# Altium schematic symbol library lib_datalogger.SchLib: 1246 symbols (part 4 of 16)
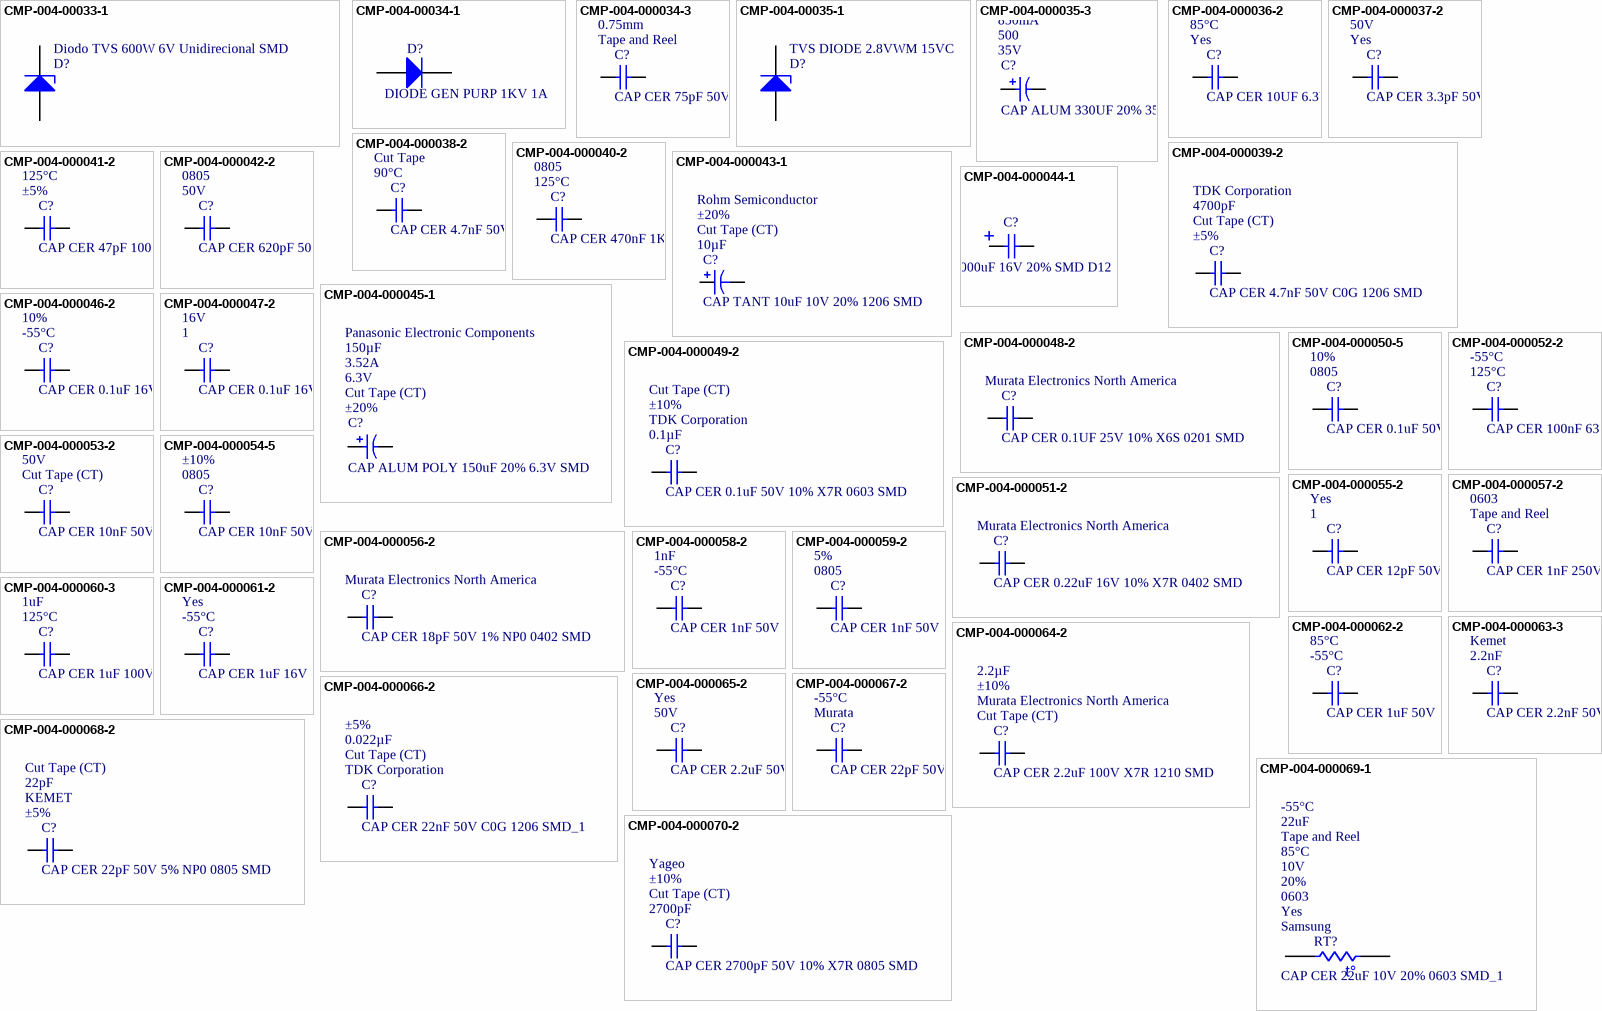
[diagram p46: symbols CMP-004-00033-1 to CMP-004-000070-2]

## CMP-004-000038-2
designator C?, comment CAP CER 4.7nF 50V C0G 0805 SMD  Max Operating Temperature: 90°C  Packaging: Cut Tape  Case/Package: 0805  Min Operating Temperature: -55°C  Tolerance: 10%  Capacitance: 4.7nF  Manufacturer: KEMET  Voltage Rating: 50V
Cap Ceramic 0.0047uF 50V X7R 10% Pad SMD 0805 125C Automotive T/R; Manufacturer Part Number: C0805C472K5RECAUTO; Max Output Current: 500mA; Min Input Voltage: 9V; Max Input Voltage: 18V; Number of Outputs: 1; Voltage - Output 1: 12V; Isolation Voltage: 3kV; Efficiency: 83%; Max Power Dissipation: 6W; Pricing 1: 1=0,30000, 10=0,20400, 100=0,11580, 500=0,08172, 1000=0,07151 (USD); Stock 1: 7793; ComponentLink2Description: https://api.kemet.com/component-edge/download/datasheet/C0805C472K5RECAUTO.pdf?src-supplier=Digi-Key; ComponentLink2URL: https://api.kemet.com/component-edge/download/datasheet/C0805C472K5RECAUTO.pdf?src-supplier=Digi-Key; ComponentLink1Description: https://product.tdk.com/info/en/catalog/datasheets/mlcc_commercial_general_en.pdf; Mount: Surface Mount; Design Item ID: CAP CER 4.7nF 50V C0G 0805 SMD; Case Code (Metric): 2012; Case Code (Imperial): 0805; ComponentLink1URL: https://product.tdk.com/info/en/catalog/datasheets/mlcc_commercial_general_en.pdf; Ratings: AEC-Q200; Features: UVLO; Source: mits.SchLib
footprint CC1005-0402 (Chip Capacitor; Body 0.039" L x 0.020" W (1.00mm x 0.50mm))
footprint CC2012-0805 (Chip Capacitor)
pins: 1, 2

## CMP-004-000039-2
designator C?, comment CAP CER 4.7nF 50V C0G 1206 SMD  Tolerance: ±5%  Packaging: Cut Tape (CT)  Capacitance: 4700pF  Manufacturer: TDK Corporation
CAP CER 4700PF 50V C0G 1206; Manufacturer Part Number: C3216C0G1H472J060AA; Temperature Coefficient: C0G, NP0; Operating Temperature: -55°C ~ 125°C; Voltage - Rated: 50V; Failure Rate: -; Height - Seated (Max): -; Applications: General Purpose; Category: Capacitors; Stock 1: 3298; Size / Dimension: 0.126" L x 0.063" W (3.20mm x 1.60mm); Lead Style: -; Features: Low ESL; Ratings: -; Pricing 1: 1=0.32, 10=0.267, 100=0.1333, 250=0.1, 500=0.08832, 1000=0.07833 (USD); Package / Case: 1206 (3216 Metric); Source: mits.SchLib; Lead Spacing: -; Part Status: Active; ComponentLink1Description: https://product.tdk.com/info/en/catalog/datasheets/mlcc_commercial_general_en.pdf; Thickness (Max): 0.028" (0.70mm); RoHS: RoHS Compliant; Design Item ID: CAP CER 4.7nF 50V C0G 1206 SMD; ComponentLink1URL: https://product.tdk.com/info/en/catalog/datasheets/mlcc_commercial_general_en.pdf; Mounting Type: Surface Mount, MLCC
footprint CC1005-0402 (Chip Capacitor; Body 0.039" L x 0.020" W (1.00mm x 0.50mm))
footprint CC3216-1206 (Chip Capacitor; Body 3.2 x 1.6 mm (LxW typ))
pins: 1, 2

## CMP-004-000040-2
designator C?, comment CAP CER 470nF 1KV X7R 3216 SMD  Max Operating Temperature: 125°C  Case/Package: 0805  Voltage Rating: 1kV  Packaging: Tape and Reel  Capacitance: 4.7nF  Tolerance: 10%  Min Operating Temperature: -55°C  Manufacturer: Wurth Electronics  Package Quantity: 1
CAP CER 4700pF 1KV  3216 SMD; Manufacturer Part Number: 885342208020; Dissipation Factor: 2.5%; Dielectric Material: Ceramic; Temperature Coefficient: 30ppm/°C; ComponentLink13URL: https://datasheet.ciiva.com/153/aphvc-153204.pdf?src-supplier=Digi-Key; ComponentLink18Description: https://datasheet.ciiva.com/11520/aphvc-11520843.pdf?src-supplier=Avnet; ComponentLink20Description: https://datasheet.ciiva.com/146/docfinderpartnumber-c1206c472kdractu-146779.pdf?src-supplier=Digi-Key; ComponentLink8Description: https://api.kemet.com/component-edge/download/datasheet/C0805V472KDRACTU.pdf?src-supplier=Digi-Key; ComponentLink8URL: https://api.kemet.com/component-edge/download/datasheet/C0805V472KDRACTU.pdf?src-supplier=Digi-Key; Lead Free: Lead Free; ComponentLink16Description: https://datasheet.ciiva.com/7833/614334-7833527.pdf?src-supplier=Element14; ComponentLink4Description: http://www.farnell.com/datasheets/2740387.pdf?src-supplier=Farnell; ComponentLink12Description: https://datasheet.ciiva.com/11787/0900766b80ed4c37-11787782.pdf?src-supplier=RSComponents; Radiation Hardening: No; Width: 0.049inch; Stock 1: 561; Dielectric: X7R; ComponentLink21Description: https://datasheet.ciiva.com/14593/70096142-14593054.pdf?src-supplier=Allied+Electronics; ComponentLink1Description: http://www.farnell.com/datasheets/2547068.pdf?src-supplier=Farnell; Category: Ceramic Capacitors; Source: mits.SchLib; ComponentLink15URL: https://datasheet.ciiva.com/153/aphvc-153206.pdf?src-supplier=Digi-Key; ComponentLink9URL: http://www.farnell.com/datasheets/1526458.pdf?src-supplier=Element14; ComponentLink11URL: https://datasheet.ciiva.com/19476/1041285-19476096.pdf?src-supplier=Jameco; Thickness: 0.055inch; ComponentLink10URL: http://www.farnell.com/datasheets/2120589.pdf?src-supplier=Element14; ComponentLink5Description: http://www.mouser.com/ds/2/212/KEM_C1034_X7R_HV_ARC_SMD-1101730.pdf?src-supplier=Mouser; ComponentLink18URL: https://datasheet.ciiva.com/11520/aphvc-11520843.pdf?src-supplier=Avnet; Design Item ID: CAP CER 470nF 1KV X7R 3216 SMD; Voltage Rating (DC): 1kV; Voltage: 1kV; ComponentLink7Description: http://www.farnell.com/datasheets/2740387.pdf?src-supplier=Newark; ComponentLink17Description: https://datasheet.ciiva.com/7833/614334-7833528.pdf?src-supplier=Element14; ComponentLink2Description: http://uk.rs-online.com/webdocs/1528/0900766b81528e46.pdf?src-supplier=RSComponents; Mount: Surface Mount; Length: 0.079inch; ComponentLink21URL: https://datasheet.ciiva.com/14593/70096142-14593054.pdf?src-supplier=Allied+Electronics; ComponentLink15Description: https://datasheet.ciiva.com/153/aphvc-153206.pdf?src-supplier=Digi-Key; Termination: SMD/SMT; ComponentLink20URL: https://datasheet.ciiva.com/146/docfinderpartnumber-c1206c472kdractu-146779.pdf?src-supplier=Digi-Key; Height: 1.25mm; Case Code (Imperial): 0805; Case Code (Metric): 2012; ComponentLink11Description: https://datasheet.ciiva.com/19476/1041285-19476096.pdf?src-supplier=Jameco; Pricing 1: 1=0,48000, 10=0,33000, 50=0,23100, 100=0,19800, 500=0,14850, 1000=0,12540 (USD); ComponentLink13Description: https://datasheet.ciiva.com/153/aphvc-153204.pdf?src-supplier=Digi-Key; ComponentLink6Description: http://components.arrow.com/part/dataview/0323_04088197?src-supplier=Arrow+Europe; ComponentLink4URL: http://www.farnell.com/datasheets/2740387.pdf?src-supplier=Farnell; ComponentLink6URL: http://components.arrow.com/part/dataview/0323_04088197?src-supplier=Arrow+Europe; Stock 2: 6610; ComponentLink2URL: http://uk.rs-online.com/webdocs/1528/0900766b81528e46.pdf?src-supplier=RSComponents; ComponentLink3Description: http://www.alliedelec.com/images/products/datasheets/bm/KEMET/70395618.pdf?src-supplier=Allied+Electronics; ComponentLink7URL: http://www.farnell.com/datasheets/2740387.pdf?src-supplier=Newark; ComponentLink14URL: https://datasheet.ciiva.com/153/aphvc-153205.pdf?src-supplier=Digi-Key; Pricing 2: 1=0,34000, 10=0,23300, 50=0,16320, 100=0,13990, 500=0,10494, 1000=0,08862 (USD); REACH SVHC: No SVHC; ComponentLink19Description: https://datasheet.ciiva.com/14594/70001075-14594431.pdf?src-supplier=Allied+Electronics; ComponentLink16URL: https://datasheet.ciiva.com/7833/614334-7833527.pdf?src-supplier=Element14; ComponentLink9Description: http://www.farnell.com/datasheets/1526458.pdf?src-supplier=Element14; ComponentLink19URL: https://datasheet.ciiva.com/14594/70001075-14594431.pdf?src-supplier=Allied+Electronics; ComponentLink3URL: http://www.alliedelec.com/images/products/datasheets/bm/KEMET/70395618.pdf?src-supplier=Allied+Electronics; ComponentLink12URL: https://datasheet.ciiva.com/11787/0900766b80ed4c37-11787782.pdf?src-supplier=RSComponents; ComponentLink14Description: https://datasheet.ciiva.com/153/aphvc-153205.pdf?src-supplier=Digi-Key; ComponentLink10Description: http://www.farnell.com/datasheets/2120589.pdf?src-supplier=Element14; ComponentLink5URL: http://www.mouser.com/ds/2/212/KEM_C1034_X7R_HV_ARC_SMD-1101730.pdf?src-supplier=Mouser; ComponentLink1URL: http://www.farnell.com/datasheets/2547068.pdf?src-supplier=Farnell; Depth: 1.25mm; ComponentLink17URL: https://datasheet.ciiva.com/7833/614334-7833528.pdf?src-supplier=Element14; Number of Pins: 2; RoHS: No; Contact Plating: Tin,Matte
footprint CC1005-0402 (Chip Capacitor; Body 0.039" L x 0.020" W (1.00mm x 0.50mm))
footprint CC3216-1206 (Chip Capacitor; Body 3.2 x 1.6 mm (LxW typ))
pins: 1, 2

## CMP-004-000041-2
designator C?, comment CAP CER 47pF 100V NP0 0603 SMD  Tolerance: ±5%  Max Operating Temperature: 125°C  Min Operating Temperature: -55°C  Package Quantity: 1  Capacitance: 47pF  Packaging: Cut Tape (CT)  Case/Package: 0603  RoHS Compliant: Yes  Manufacturer: Kemet
CAP CER 47PF 100V C0G/NP0 0603; Manufacturer Part Number: C0603C470J1GACTU; Dielectric: C0G; Material: Ceramic; Temperature Coefficient: C0G, NP0; Thickness: 0.035inch; Part Status: Active; Case Code (Metric): 1608; Size / Dimension: 0.063" L x 0.031" W (1.60mm x 0.80mm); Mounting Type: Surface Mount, MLCC; Design Item ID: CAP CER 47pF 100V NP0 0603 SMD; Pricing 1: 1=0.1, 10=0.041, 50=0.0222, 100=0.0187, 250=0.01532, 500=0.0131, 1000=0.0102 (USD); Construction: Flat; Category: Capacitors; Stock 2: 970650; Ratings: -; Features: Low ESL; ComponentLink5Description: https://datasheet.ciiva.com/26310/mlcc-catalogdownload2013-eng-26310294.pdf?src-supplier=Distrelec; Depth: 0.8mm; Radiation Hardening: No; RoHS: RoHS Compliant; Package / Case: 0603 (1608 Metric); ComponentLink3Description: https://datasheet.ciiva.com/26838/getdatasheetpartid-359564-26838540.pdf?src-supplier=Verical; Voltage - Rated: 100V; Case Code (Imperial): 0603; ComponentLink2URL: https://datasheet.ciiva.com/25803/cl10c470jb8nnnc-25803543.pdf?src-supplier=Digi-Key; Applications: General Purpose; ComponentLink3URL: https://datasheet.ciiva.com/26838/getdatasheetpartid-359564-26838540.pdf?src-supplier=Verical; Pricing 2: 50=0,00730, 500=0,00550, 1500=0,00510, 5000=0,00480, 25000=0,00460, 50000=0,00460, 50=0,00710, 500=0,00530, 1500=0,00490, 5000=0,00470, 25000=0,00440, 50000=0,00440, 50=0,03680, 500=0,02760, 1500=0,02560, 5000=0,02430, 25000=0,02300, 50000=0,02300, 50=0,03540, 500=0,02650, 1500=0,02460, 5000=0,02340, 25000=0,02210, 50000=0,02210, 50=0,00480, 500=0,00360, 1500=0,00330, 5000=0,00310, 25000=0,00300, 50000=0,00300, 50=0,00410, 500=0,00300, 1500=0,00280, 5000=0,00270, 25000=0,00250, 50000=0,00250, 50=0,04350, 500=0,03260, 1500=0,03030, 5000=0,02880, 25000=0,02720, 50000=0,02720, 50=0,61520, 500=0,46140, 1500=0,42850, 5000=0,40650, 25000=0,38450, 50000=0,38450, 50=0,02320, 500=0,01740, 1500=0,01620, 5000=0,01530, 25000=0,01450, 50000=0,01450, 50=0,42360, 500=0,31770, 1500=0,29500, 5000=0,27990, 25000=0,26480, 50000=0,26480, 50=0,04860, 500=0,03650, 1500=0,03390, 5000=0,03210, 25000=0,03040, 50000=0,03040, 50=0,00750, 500=0,00570, 1500=0,00530, 5000=0,00500, 25000=0,00470, 50000=0,00470, 50=0,00560, 500=0,00420, 1500=0,00390, 5000=0,00370, 25000=0,00350, 50000=0,00350 (AUD); ComponentLink2Description: https://datasheet.ciiva.com/25803/cl10c470jb8nnnc-25803543.pdf?src-supplier=Digi-Key; Height - Seated (Max): -; Stock 1: 275177; Source: mits.SchLib; Height: 0.8mm; ComponentLink1URL: http://www.kemet.com/docfinder?Partnumber=C0603C470J1GACTU; Width: 0.031inch; Series: CL; ComponentLink5URL: https://datasheet.ciiva.com/26310/mlcc-catalogdownload2013-eng-26310294.pdf?src-supplier=Distrelec; Thickness (Max): 0.034" (0.87mm); ComponentLink1Description: http://www.kemet.com/docfinder?Partnumber=C0603C470J1GACTU; Lead Style: -; ComponentLink4Description: https://datasheet.ciiva.com/29198/456890-da-01-en-vs-kondensator-0603-29198885.pdf?src-supplier=Conrad; Lead Spacing: -; Lead Free: Lead Free; Mount: Surface Mount; Operating Temperature: -55°C ~ 125°C; ComponentLink4URL: https://datasheet.ciiva.com/29198/456890-da-01-en-vs-kondensator-0603-29198885.pdf?src-supplier=Conrad; Length: 1.6mm
footprint CC1005-0402 (Chip Capacitor; Body 0.039" L x 0.020" W (1.00mm x 0.50mm))
footprint CC1608-0603 (Chip Capacitor; Body 1.6 x 0.8 mm (LxW typ))
pins: 1, 2

## CMP-004-000042-2
designator C?, comment CAP CER 620pF 50V C0G 0805 SMD  Voltage Rating: 50V  Case/Package: 0805  Package Quantity: 4000  Capacitance: 620pF  Manufacturer: Kyocera AVX  Min Operating Temperature: -55°C  Packaging: Tape and Reel  Tolerance: 5%  Max Operating Temperature: 125°C
CAP CER 620PF 50V NP0 0805; Manufacturer Part Number: 08055A621JAT2A; Voltage Rating (DC): 50V; Category: Ceramic Capacitors; Termination: SMD/SMT; ComponentLink3Description: https://datasheet.ciiva.com/5418/ccog-243403-5418887.pdf?src-supplier=Mouser; Case Code (Imperial): 0805; Pricing 1: 1=0,32000, 10=0,22100, 100=0,13280, 500=0,09962, 1000=0,08412 (USD); Radiation Hardening: No; Source: mits.SchLib; Mount: Surface Mount; REACH SVHC: Unknown; Dielectric: C0G; Thickness: 0.037inch; RoHS: Yes; Depth: 1.25mm; ComponentLink1Description: https://datasheet.ciiva.com/207/ccog-207129.pdf?src-supplier=Digi-Key; Stock 1: 99192; Design Item ID: CAP CER 620pF 50V C0G 0805 SMD; Height: 0.94mm; ComponentLink3URL: https://datasheet.ciiva.com/5418/ccog-243403-5418887.pdf?src-supplier=Mouser; ComponentLink2Description: https://datasheet.ciiva.com/11565/ccog-11565614.pdf?src-supplier=Avnet; ComponentLink2URL: https://datasheet.ciiva.com/11565/ccog-11565614.pdf?src-supplier=Avnet; Number of Pins: 2; Width: 1.25mm; Length: 2.01mm; ComponentLink1URL: https://datasheet.ciiva.com/207/ccog-207129.pdf?src-supplier=Digi-Key; Case Code (Metric): 2012
footprint CC1005-0402 (Chip Capacitor; Body 0.039" L x 0.020" W (1.00mm x 0.50mm))
footprint CC2012-0805 (Chip Capacitor)
pins: 1, 2

## CMP-004-000043-1
designator C?, comment CAP TANT 10uF 10V 20% 1206 SMD  Capacitance: 10µF  Packaging: Cut Tape (CT)  Tolerance: ±20%  Manufacturer: Rohm Semiconductor
CAP TANT 10UF 10V 20% 1206; Manufacturer Part Number: TCA1A106M8R; Manufacturer Size Code: A; Type: Molded; ESR (Equivalent Series Resistance): 3 Ohm; Pricing 1: 1=0.52, 10=0.368, 25=0.3144, 50=0.2784, 100=0.2425, 250=0.2066, 500=0.17964, 1000=0.15269 (USD); Failure Rate: -; Category: Capacitors; Features: General Purpose; ComponentLink1URL: http://rohmfs.rohm.com/en/products/databook/datasheet/passive/tantalum_capacitor/tantalum_chip_capacitor/tc_a.pdf; Voltage - Rated: 10V; Size / Dimension: 0.126" L x 0.063" W (3.20mm x 1.60mm); Part Status: Active; Mounting Type: Surface Mount; Lead Spacing: -; Package / Case: 1206 (3216 Metric); RoHS: RoHS Compliant; Stock 1: 45858; ComponentLink1Description: http://rohmfs.rohm.com/en/products/databook/datasheet/passive/tantalum_capacitor/tantalum_chip_capacitor/tc_a.pdf; Design Item ID: CAP TANT 10uF 10V 20% 1206 SMD; Lifetime @ Temp.: -; Height - Seated (Max): 0.071" (1.80mm); Source: mits.SchLib; Operating Temperature: -55°C ~ 125°C
footprint CAP TANT CASE R 0805 (0.081" L x 0.051" W (2.05mm x 1.30mm))
footprint CC TANT 1206
pins: 1, 2

## CMP-004-000044-1
designator C?, comment CAP ALUM 1000uF 16V 20% SMD D12 1010  Max Operating Temperature: 105°C  Capacitance: 1000uF  Tolerance: 20%  Min Operating Temperature: -55°C  RoHS Compliant: Yes
SMD 1000UF ±20% 16V SMD,10X10MM ROHS; Manufacturer Part Number 1: EEE-FN1C102UP; Manufacturer 1: Panasonic; Dielectric: X5R; Dielectric Material: Electrolytic; Design Item ID: CAP ALUM 1000uF 16V 20% SMD D12 1010; Source: mits.SchLib; Voltage Rating (DC): 16V
footprint CAP_SMD_D12_1010
footprint CAP_SMD_D12_1010
pins: 1, 2

## CMP-004-000045-1
designator C?, comment CAP ALUM POLY 150uF 20% 6.3V SMD  Tolerance: ±20%  Packaging: Cut Tape (CT)  Voltage Rating: 6.3V  Ripple Current: 3.52A  Capacitance: 150µF  Manufacturer: Panasonic Electronic Components
Manufacturer Part Number: 6SVPE150M; Surface Mount Land Size: 0.209" L x 0.209" W (5.30mm x 5.30mm); ESR (Equivalent Series Resistance): 12 mOhm; Polarization: Polar; Lifetime @ Temp.: 2000 Hrs @ 105°C; Source: mits.SchLib; Operating Temperature: -55°C ~ 105°C; Applications: -; Part Status: Active; Size / Dimension: 0.197" Dia (5.00mm); Mounting Type: Surface Mount; ComponentLink1Description: http://industrial.panasonic.com/www-cgi/jvcr13pz.cgi?E+CI+4+AAB8002+6SVPE150M+8+WW; Height - Seated (Max): 0.236" (6.00mm); Pricing 1: 1=1.05, 10=0.881, 25=0.7592, 50=0.7126, 100=0.5625, 250=0.46876, 500=0.42188 (USD); Design Item ID: CAP ALUM POLY 150uF 20% 6.3V SMD; Lead Spacing: -; Category: Capacitors; ComponentLink1URL: http://industrial.panasonic.com/www-cgi/jvcr13pz.cgi?E+CI+4+AAB8002+6SVPE150M+8+WW; Package / Case: Radial, Can - SMD; Stock 1: 3806; RoHS: RoHS Compliant; Impedance: -
footprint CAP_SMD_D5_H6
footprint CAP_SMD_D5_H6
pins: 1, 2
1 alternate drawing of the same symbol

## CMP-004-000046-2
designator C?, comment CAP CER 0.1uF 16V 10% X7R 0402 SMD  Min Operating Temperature: -55°C  Tolerance: 10%  Manufacturer: Murata Electronics North America  Capacitance: 100nF  Max Operating Temperature: 125°C  Voltage Rating: 16V  Packaging: Tape and Reel  Case/Package: 0402  Package Quantity: 1
CAP CER 0.1UF 16V X7R 0402; Part#: GRM155R71C104KA88D; Manufacturer Part Number: CL05B104KO5NNNC; eVendorPrice: 0,10; Material: Ceramic; eVendor: Digi-Key; MSRP: 0,00313; eVendor#: 490-3261-1-ND; Case Code (Metric): 1005; ComponentLink2URL: https://datasheet.ciiva.com/29198/458718-da-01-en-vs-kondensator-0402-29198423.pdf?src-supplier=Conrad; Mount: Surface Mount; Case Code (Imperial): 0402; ComponentLink1URL: https://datasheet.ciiva.com/26920/getdatasheetpartid-359683-26920169.pdf?src-supplier=Verical; Height: 0.5mm; Category: Ceramic Capacitors; Dielectric: X7R; Voltage Rating (DC): 16V; ComponentLink4URL: https://datasheet.ciiva.com/26309/mlcc-catalogdownload2013-eng-26309003.pdf?src-supplier=Distrelec; RoHS: Yes; Source: mits.SchLib; Depth: 0.5mm; ComponentLink3Description: https://datasheet.ciiva.com/16208/cl05b104kq5nnnc-16208343.pdf?src-supplier=Future+Electronics; Design Item ID: CAP CER 0.1uF 16V 10% X7R 0402 SMD; Length: 1mm; ComponentLink1Description: https://datasheet.ciiva.com/26920/getdatasheetpartid-359683-26920169.pdf?src-supplier=Verical; ComponentLink3URL: https://datasheet.ciiva.com/16208/cl05b104kq5nnnc-16208343.pdf?src-supplier=Future+Electronics; MOQ: 5000; Thickness: 0.022inch; Datasheet: http://search.murata.co.jp/Ceramy/image/img/A01X/G101/ENG/GRM155R71C104KA88-01.pdf; Width: 0.02inch; Radiation Hardening: No; Contact Plating: Tin; Voltage: 16V; ComponentLink4Description: https://datasheet.ciiva.com/26309/mlcc-catalogdownload2013-eng-26309003.pdf?src-supplier=Distrelec; Lead Free: Lead Free; ComponentLink2Description: https://datasheet.ciiva.com/29198/458718-da-01-en-vs-kondensator-0402-29198423.pdf?src-supplier=Conrad; Stock 1: 7150300; Pricing 1: 100=0,00220, 1000=0,00170, 3000=0,00160, 10000=0,00140, 50000=0,00140, 100000=0,00130, 100=0,00210, 1000=0,00160, 3000=0,00150, 10000=0,00140, 50000=0,00140, 100000=0,00130, 100=0,01120, 1000=0,00850, 3000=0,00790, 10000=0,00720, 50000=0,00720, 100000=0,00660, 100=0,01070, 1000=0,00820, 3000=0,00760, 10000=0,00690, 50000=0,00690, 100000=0,00630, 100=0,00140, 1000=0,00110, 3000=0,00100, 10000=0,00090, 50000=0,00090, 100000=0,00080, 100=0,00120, 1000=0,00090, 3000=0,00090, 10000=0,00080, 50000=0,00080, 100000=0,00070, 100=0,01320, 1000=0,01010, 3000=0,00930, 10000=0,00860, 50000=0,00860, 100000=0,00780, 100=0,18680, 1000=0,14280, 3000=0,13180, 10000=0,12090, 50000=0,12090, 100000=0,10990, 100=0,00700, 1000=0,00540, 3000=0,00500, 10000=0,00460, 50000=0,00460, 100000=0,00410, 100=0,12860, 1000=0,09830, 3000=0,09080, 10000=0,08320, 50000=0,08320, 100000=0,07570, 100=0,01480, 1000=0,01130, 3000=0,01040, 10000=0,00960, 50000=0,00960, 100000=0,00870, 100=0,00230, 1000=0,00180, 3000=0,00160, 10000=0,00150, 50000=0,00150, 100000=0,00130, 100=0,00170, 1000=0,00130, 3000=0,00120, 10000=0,00110, 50000=0,00110, 100000=0,00100 (AUD)
footprint CC1005-0402 (Chip Capacitor; Body 0.039" L x 0.020" W (1.00mm x 0.50mm))
footprint CC1005-0402-3 (Chip Capacitor; Body 0.039" L x 0.020" W (1.00mm x 0.50mm))
pins: 1, 2

## CMP-004-000047-2
designator C?, comment CAP CER 0.1uF 16V 10% X7R 0603 SMD  Package Quantity: 1  Voltage Rating: 16V  Packaging: Tape and Reel  RoHS Compliant: Yes  Min Operating Temperature: -55°C  Capacitance: 100nF  Max Operating Temperature: 125°C  Case/Package: 0603  Manufacturer: Samsung  Tolerance: 10%
Ceramic capacitor SMD-0603 100nF /16V X7R# K +-10%, Samsung, RoHS; Manufacturer Part Number: CL10B104KO8NNNC; Length: 1.6mm; Contact Plating: Tin; Thickness: 0.035inch; Mount: Surface Mount; Material: Ceramic; Height: 0.8mm; Lead Free: Lead Free; Series: CL; Stock 1: 1535200; Pricing 1: 50=0,00510, 500=0,00380, 1500=0,00350, 5000=0,00330, 25000=0,00310, 50000=0,00310, 50=0,00490, 500=0,00370, 1500=0,00340, 5000=0,00310, 25000=0,00300, 50000=0,00300, 50=0,02560, 500=0,01910, 1500=0,01770, 5000=0,01640, 25000=0,01580, 50000=0,01580, 50=0,02460, 500=0,01830, 1500=0,01710, 5000=0,01580, 25000=0,01520, 50000=0,01520, 50=0,00330, 500=0,00250, 1500=0,00230, 5000=0,00210, 25000=0,00200, 50000=0,00200, 50=0,00280, 500=0,00210, 1500=0,00200, 5000=0,00180, 25000=0,00170, 50000=0,00170, 50=0,03030, 500=0,02250, 1500=0,02100, 5000=0,01940, 25000=0,01870, 50000=0,01870, 50=0,42850, 500=0,31860, 1500=0,29660, 5000=0,27470, 25000=0,26370, 50000=0,26370, 50=0,01620, 500=0,01200, 1500=0,01120, 5000=0,01040, 25000=0,00990, 50000=0,00990, 50=0,29500, 500=0,21940, 1500=0,20430, 5000=0,18910, 25000=0,18160, 50000=0,18160, 50=0,03390, 500=0,02520, 1500=0,02340, 5000=0,02170, 25000=0,02080, 50000=0,02080, 50=0,00530, 500=0,00390, 1500=0,00360, 5000=0,00340, 25000=0,00320, 50000=0,00320, 50=0,00390, 500=0,00290, 1500=0,00270, 5000=0,00250, 25000=0,00240, 50000=0,00240 (AUD); ComponentLink1Description: https://datasheet.ciiva.com/25805/cl10b104ko8nnnc-25805483.pdf?src-supplier=Digi-Key; Dielectric: X7R; Category: Ceramic Capacitors; ComponentLink1URL: https://datasheet.ciiva.com/25805/cl10b104ko8nnnc-25805483.pdf?src-supplier=Digi-Key; RoHS: Yes; Voltage: 16V; Depth: 0.8mm; Case Code (Metric): 1608; ComponentLink3Description: https://datasheet.ciiva.com/29198/456679-da-01-en-vs-kondensator-0603-29198846.pdf?src-supplier=Conrad; Design Item ID: CAP CER 0.1uF 16V 10% X7R 0603 SMD; Case Code (Imperial): 0603; ComponentLink2Description: https://datasheet.ciiva.com/26838/getdatasheetpartid-357417-26838418.pdf?src-supplier=Verical; Width: 0.031inch; Radiation Hardening: No; ComponentLink3URL: https://datasheet.ciiva.com/29198/456679-da-01-en-vs-kondensator-0603-29198846.pdf?src-supplier=Conrad; ComponentLink2URL: https://datasheet.ciiva.com/26838/getdatasheetpartid-357417-26838418.pdf?src-supplier=Verical; Source: mits.SchLib; Voltage Rating (DC): 16V
footprint CC1005-0402 (Chip Capacitor; Body 0.039" L x 0.020" W (1.00mm x 0.50mm))
footprint CC1608-0603 (Chip Capacitor; Body 1.6 x 0.8 mm (LxW typ))
pins: 1, 2

## CMP-004-000048-2
designator C?, comment CAP CER 0.1UF 25V 10% X6S 0201 SMD  Manufacturer: Murata Electronics North America
CAP CER 0.1UF 25V 10% X6S 0201; Part#: GRM033C81E104KE14D; eVendorPrice: 0,10; eVendor: Digi-Key; MSRP: 0,01075; eVendor#: 490-10403-1-ND; MOQ: 5000; Design Item ID: CAP CER 0.1UF 25V 10% X6S 0201 SMD; Source: mits.SchLib; Datasheet: http://www.murata.com/~/media/webrenewal/support/library/catalog/products/capacitor/mlcc/c02e.ashx
footprint CC1005-0402 (Chip Capacitor; Body 0.039" L x 0.020" W (1.00mm x 0.50mm))
footprint CC0603-0201 (Chip Capacitor; Body 0.024" L x 0.012" W (0.60mm x 0.30mm))
pins: 1, 2

## CMP-004-000049-2
designator C?, comment CAP CER 0.1uF 50V 10% X7R 0603 SMD  Capacitance: 0.1µF  Manufacturer: TDK Corporation  Tolerance: ±10%  Packaging: Cut Tape (CT)
CAP CER 0.1UF 50V 10% X7R 0603; Manufacturer Part Number: C1608X7R1H104K080AA; eVendor#: 445-1314-1-ND; eVendor: Digi-Key; eVendorPrice: 0,10; MSRP: 0,012; Category: Capacitors; Ratings: -; Lead Spacing: -; Thickness (Max): 0.037" (0.95mm); Size / Dimension: 0.063" L x 0.031" W (1.60mm x 0.80mm); Source: mits.SchLib; Design Item ID: CAP CER 0.1uF 50V 10% X7R 0603 SMD; Features: -; Mounting Type: Surface Mount, MLCC; MOQ: 1000; Operating Temperature: -55°C ~ 125°C; Package / Case: 0603 (1608 Metric); ComponentLink1URL: https://product.tdk.com/info/en/catalog/datasheets/mlcc_commercial_general_en.pdf; Temperature Coefficient: X7R; ComponentLink1Description: https://product.tdk.com/info/en/catalog/datasheets/mlcc_commercial_general_en.pdf; Applications: General Purpose; Part#: C1608X7R1H104K080AA; RoHS: RoHS Compliant; Height - Seated (Max): -; Datasheet: http://www.tdk.com/pdf/TDKMLCCCapRange.pdf; Pricing 1: 1=0.1, 10=0.048, 100=0.022, 250=0.018, 500=0.0154, 1000=0.012 (USD); Voltage - Rated: 50V; Lead Style: -; Stock 1: 1444123
footprint CC1005-0402 (Chip Capacitor; Body 0.039" L x 0.020" W (1.00mm x 0.50mm))
footprint CC1608-0603 (Chip Capacitor; Body 1.6 x 0.8 mm (LxW typ))
pins: 1, 2

## CMP-004-000050-5
designator C?, comment CAP CER 0.1uF 50V 10% X7R 0805 SMD  Case/Package: 0805  Tolerance: 10%  Min Operating Temperature: -55°C  Voltage Rating: 50V  Packaging: Tape and Reel  Max Operating Temperature: 125°C  Capacitance: 100nF  Manufacturer: Kyocera AVX  Package Quantity: 1
CAP CER 0.1UF 50V 10% X7R 0805; Manufacturer Part Number: 08055C104KAT2A; Insulation Resistance: 100GR; Dielectric Material: Ceramic; Dissipation Factor: 2.5%; Dielectric: X7R; Case Code (Imperial): 0805; ComponentLink8URL: https://datasheet.ciiva.com/16536/cx7r-16536873.pdf?src-supplier=Avnet+Asia; ComponentLink5URL: https://datasheet.ciiva.com/150/cx7r-150258.pdf?src-supplier=Digi-Key; Pricing 1: 1=0,12500, 25=0,10300, 50=0,07500, 100=0,04600, 250=0,04000, 500=0,03300, 1000=0,02100 (USD); Case Code (Metric): 2012; ComponentLink6Description: https://datasheet.ciiva.com/150/cx7r-150259.pdf?src-supplier=Digi-Key; ComponentLink4Description: https://datasheet.ciiva.com/150/cx7r-150257.pdf?src-supplier=Digi-Key; ComponentLink7URL: https://datasheet.ciiva.com/16199/cx7r-16199014.pdf?src-supplier=Future+Electronics; Design Item ID: CAP CER 0.1uF 50V 10% X7R 0805 SMD; ComponentLink8Description: https://datasheet.ciiva.com/16536/cx7r-16536873.pdf?src-supplier=Avnet+Asia; ComponentLink2Description: https://datasheet.ciiva.com/19475/2009691-19475858.pdf?src-supplier=Jameco; ComponentLink11Description: https://datasheet.ciiva.com/2988/cx7r-2988014.pdf?src-supplier=Avnet; ComponentLink9Description: https://datasheet.ciiva.com/16536/cx7r-16536875.pdf?src-supplier=Avnet+Asia; ComponentLink12Description: https://datasheet.ciiva.com/5416/cx7r-5416959.pdf?src-supplier=Mouser; ComponentLink7Description: https://datasheet.ciiva.com/16199/cx7r-16199014.pdf?src-supplier=Future+Electronics; Pricing 2: 4000=0,018800 (USD); Source: mits.SchLib; ComponentLink13URL: https://datasheet.ciiva.com/7812/cx7r-7812079.pdf?src-supplier=Element14; Thickness: 0.037inch; Lead Free: Lead Free; ComponentLink2URL: https://datasheet.ciiva.com/19475/2009691-19475858.pdf?src-supplier=Jameco; ComponentLink3Description: https://datasheet.ciiva.com/11786/0900766b802d4698-11786116.pdf?src-supplier=RSComponents; Category: Ceramic Capacitors; ComponentLink1URL: http://datasheets.avx.com/X7RDielectric.pdf; ComponentLink5Description: https://datasheet.ciiva.com/150/cx7r-150258.pdf?src-supplier=Digi-Key; Length: 2.01mm; Voltage Rating (DC): 50V; ComponentLink6URL: https://datasheet.ciiva.com/150/cx7r-150259.pdf?src-supplier=Digi-Key; ComponentLink9URL: https://datasheet.ciiva.com/16536/cx7r-16536875.pdf?src-supplier=Avnet+Asia; Width: 0.049inch; Radiation Hardening: No; ComponentLink4URL: https://datasheet.ciiva.com/150/cx7r-150257.pdf?src-supplier=Digi-Key; Stock 1: 745624; Mount: Surface Mount,PCB; Number of Pins: 2; ComponentLink3URL: https://datasheet.ciiva.com/11786/0900766b802d4698-11786116.pdf?src-supplier=RSComponents; ComponentLink11URL: https://datasheet.ciiva.com/2988/cx7r-2988014.pdf?src-supplier=Avnet; ComponentLink10Description: https://datasheet.ciiva.com/11504/cx7r-11504044.pdf?src-supplier=Avnet; Stock 2: 76000; ComponentLink1Description: http://datasheets.avx.com/X7RDielectric.pdf; ComponentLink10URL: https://datasheet.ciiva.com/11504/cx7r-11504044.pdf?src-supplier=Avnet; REACH SVHC: No SVHC; Voltage: 50V; Height: 0.94mm; ComponentLink12URL: https://datasheet.ciiva.com/5416/cx7r-5416959.pdf?src-supplier=Mouser; ComponentLink13Description: https://datasheet.ciiva.com/7812/cx7r-7812079.pdf?src-supplier=Element14; Termination: SMD/SMT; RoHS: Yes; Depth: 1.25mm
footprint CC1005-0402 (Chip Capacitor; Body 0.039" L x 0.020" W (1.00mm x 0.50mm))
footprint CC2012-0805 (Chip Capacitor)
pins: 1, 2

## CMP-004-000051-2
designator C?, comment CAP CER 0.22uF 16V 10% X7R 0402 SMD  Manufacturer: Murata Electronics North America
CAP CER 0.22UF 16V 10% X7R 0402; Part#: GRM155R71C224KA12D; eVendorPrice: 0,10; eVendor#: 490-5418-1-ND; eVendor: Digi-Key; MSRP: 0,01575; Design Item ID: CAP CER 0.22uF 16V 10% X7R 0402 SMD; Source: mits.SchLib; MOQ: 5000; Datasheet: http://search.murata.co.jp/Ceramy/image/img/A01X/partnumbering_e_01.pdf
footprint CC1005-0402 (Chip Capacitor; Body 0.039" L x 0.020" W (1.00mm x 0.50mm))
footprint CC1005-0402 (Chip Capacitor; Body 0.039" L x 0.020" W (1.00mm x 0.50mm))
pins: 1, 2

## CMP-004-000052-2
designator C?, comment CAP CER 100nF 630V X7R 1812 SMD  Max Operating Temperature: 125°C  Min Operating Temperature: -55°C  Capacitance: 100nF  Package Quantity: 1000  Case/Package: 1812  Voltage Rating: 630V  Packaging: Cut Tape  Tolerance: 10%
100nF ±10% 630V X7R 1812 Multilayer Ceramic Capacitors MLCC - SMD/SMT RoHS; Manufacturer 1: HUI JU; Manufacturer Part Number 1: NM1812B104K631CEKN; Dielectric Material: Ceramic; Case Code (Metric): 1812; Source: mits.SchLib; Design Item ID: CAP CER 100nF 630V X7R 1812 SMD; Voltage: 630V; Category: Ceramic Capacitors; Termination: SMD/SMT; Number of Pins: 2; Dielectric: X7R; Case Code (Imperial): 4532; Mount: Surface Mount
footprint CC1005-0402 (Chip Capacitor; Body 0.039" L x 0.020" W (1.00mm x 0.50mm))
footprint CC4532-1812 (Chip Capacitor)
pins: 1, 2

## CMP-004-000053-2
designator C?, comment CAP CER 10nF 50V 10% X7R 0603 SMD  Packaging: Cut Tape (CT)  Voltage Rating: 50V  Min Operating Temperature: -55°C  Manufacturer: Hitano  Package Quantity: 1  Case/Package: 0603  Tolerance: 10%  Capacitance: 10nF  Max Operating Temperature: 125°C
Cap Ceramic 0.01uF 50VDC X7R 10% SMD 0603 Paper T/R; Part#: C1608X7R1H103K080AA; Manufacturer Part Number: 0603B103K500NT-ROHS; eVendor#: 445-1311-1-ND; MSRP: 0,006; eVendor: Digi-Key; eVendorPrice: 0,10; Width: 0.031inch; Lead Free: Lead Free; Features: -; Size / Dimension: 0.063" L x 0.031" W (1.60mm x 0.80mm); RoHS: RoHS Compliant; Height: 0.8mm; Voltage - Rated: 50V; Lead Spacing: -; Mounting Type: Surface Mount, MLCC; Case Code (Metric): 1608; Datasheet: http://www.tdk.com/pdf/TDKMLCCCapRange.pdf; Mount: Surface Mount; Temperature Coefficient: X7R; Thickness: 0.035inch; Length: 1.6mm; ComponentLink3Description: https://datasheet.ciiva.com/29198/457455-da-01-en-vs-kondensator-0603-29198644.pdf?src-supplier=Conrad; Depth: 0.8mm; Category: Uncategorized; Stock 3: 2848150; Ratings: -; ComponentLink2Description: https://datasheet.ciiva.com/15195/getdatasheetpartid-357415-15195721.pdf?src-supplier=Verical; Voltage Rating (DC): 50V; Dielectric: X7R; Thickness (Max): 0.037" (0.95mm); Material: Ceramic; Lead Style: -; Stock 2: 2848150; Operating Temperature: -55°C ~ 125°C; ComponentLink1URL: https://product.tdk.com/info/en/catalog/datasheets/mlcc_commercial_general_en.pdf; Applications: General Purpose; Design Item ID: CAP CER 10nF 50V 10% X7R 0603 SMD; Series: CL; Pricing 1: 1=0.1, 10=0.024, 100=0.011, 250=0.009, 500=0.0077, 1000=0.006 (USD); Pricing 2: 50=0,00480, 500=0,00350, 1500=0,00340, 5000=0,00310, 25000=0,00300, 50000=0,00300, 50=0,00470, 500=0,00340, 1500=0,00330, 5000=0,00300, 25000=0,00290, 50000=0,00290, 50=0,02430, 500=0,01770, 1500=0,01710, 5000=0,01580, 25000=0,01510, 50000=0,01510, 50=0,02340, 500=0,01710, 1500=0,01640, 5000=0,01520, 25000=0,01450, 50000=0,01450, 50=0,00310, 500=0,00230, 1500=0,00220, 5000=0,00200, 25000=0,00200, 50000=0,00200, 50=0,00270, 500=0,00200, 1500=0,00190, 5000=0,00170, 25000=0,00170, 50000=0,00170, 50=0,02880, 500=0,02100, 1500=0,02020, 5000=0,01870, 25000=0,01790, 50000=0,01790, 50=0,40650, 500=0,29660, 1500=0,28570, 5000=0,26370, 25000=0,25270, 50000=0,25270, 50=0,01530, 500=0,01120, 1500=0,01080, 5000=0,00990, 25000=0,00950, 50000=0,00950, 50=0,27990, 500=0,20430, 1500=0,19670, 5000=0,18160, 25000=0,17400, 50000=0,17400, 50=0,03210, 500=0,02340, 1500=0,02260, 5000=0,02080, 25000=0,02000, 50000=0,02000, 50=0,00500, 500=0,00360, 1500=0,00350, 5000=0,00320, 25000=0,00310, 50000=0,00310, 50=0,00370, 500=0,00270, 1500=0,00260, 5000=0,00240, 25000=0,00230, 50000=0,00230 (AUD); Height - Seated (Max): -; Contact Plating: Tin; ComponentLink4URL: https://datasheet.ciiva.com/20173/71-0315-20173334.pdf?src-supplier=Rapid+Electronics; Source: mits.SchLib; ComponentLink3URL: https://datasheet.ciiva.com/29198/457455-da-01-en-vs-kondensator-0603-29198644.pdf?src-supplier=Conrad; Stock 1: 291225; Voltage: 50V; Construction: Flat; Radiation Hardening: No; ComponentLink2URL: https://datasheet.ciiva.com/15195/getdatasheetpartid-357415-15195721.pdf?src-supplier=Verical; ComponentLink1Description: https://product.tdk.com/info/en/catalog/datasheets/mlcc_commercial_general_en.pdf; Case Code (Imperial): 0603; MOQ: 1000; ComponentLink4Description: https://datasheet.ciiva.com/20173/71-0315-20173334.pdf?src-supplier=Rapid+Electronics; Package / Case: 0603 (1608 Metric); Pricing 3: 50=0,00480, 500=0,00350, 1500=0,00340, 5000=0,00310, 25000=0,00300, 50000=0,00300, 50=0,00470, 500=0,00340, 1500=0,00330, 5000=0,00300, 25000=0,00290, 50000=0,00290, 50=0,02430, 500=0,01770, 1500=0,01710, 5000=0,01580, 25000=0,01510, 50000=0,01510, 50=0,02340, 500=0,01710, 1500=0,01640, 5000=0,01520, 25000=0,01450, 50000=0,01450, 50=0,00310, 500=0,00230, 1500=0,00220, 5000=0,00200, 25000=0,00200, 50000=0,00200, 50=0,00270, 500=0,00200, 1500=0,00190, 5000=0,00170, 25000=0,00170, 50000=0,00170, 50=0,02880, 500=0,02100, 1500=0,02020, 5000=0,01870, 25000=0,01790, 50000=0,01790, 50=0,40650, 500=0,29660, 1500=0,28570, 5000=0,26370, 25000=0,25270, 50000=0,25270, 50=0,01530, 500=0,01120, 1500=0,01080, 5000=0,00990, 25000=0,00950, 50000=0,00950, 50=0,27990, 500=0,20430, 1500=0,19670, 5000=0,18160, 25000=0,17400, 50000=0,17400, 50=0,03210, 500=0,02340, 1500=0,02260, 5000=0,02080, 25000=0,02000, 50000=0,02000, 50=0,00500, 500=0,00360, 1500=0,00350, 5000=0,00320, 25000=0,00310, 50000=0,00310, 50=0,00370, 500=0,00270, 1500=0,00260, 5000=0,00240, 25000=0,00230, 50000=0,00230 (AUD)
footprint CC1005-0402 (Chip Capacitor; Body 0.039" L x 0.020" W (1.00mm x 0.50mm))
footprint CC1608-0603 (Chip Capacitor; Body 1.6 x 0.8 mm (LxW typ))
pins: 1, 2

## CMP-004-000054-5
designator C?, comment CAP CER 10nF 50V 10% X7R 0805 SMD  Case/Package: 0805  Tolerance: ±10%  Packaging: Cut Tape (CT)  Min Operating Temperature: -55°C  Capacitance: 10000pF  Lead Pitch: 0.75mm  Package Quantity: 1  Voltage Rating: 50V  Manufacturer: Murata Electronics North America  Max Operating Temperature: 125°C
CAP CER 10nF 50V 10% X7R 0805; Part#: GRM216R71H103KA01D; Dielectric: C0G; eVendor#: 490-1664-1-ND; Dielectric Material: Ceramic; eVendorPrice: 0,10; Dissipation Factor: 0.1%; Insulation Resistance: 100GR; MSRP: 0,00777; eVendor: Digi-Key; Contact Material: Tin; ComponentLink21Description: https://datasheet.ciiva.com/26894/getdatasheetpartid-725048-26894080.pdf?src-supplier=Verical; ComponentLink14URL: http://components.arrow.com/part/dataview/0323_00011329?src-supplier=Arrow+Europe; ComponentLink11Description: https://datasheet.ciiva.com/7842/1776094-7842154.pdf?src-supplier=Element14; Lead Spacing: -; Features: -; ComponentLink19URL: https://api.kemet.com/component-edge/download/datasheet/C0805C103K5RACTU.pdf?src-supplier=Digi-Key; Width: 1.2mm; Height: 0.78mm; ComponentLink7URL: https://datasheet.ciiva.com/28672/1789732-28672793.pdf?src-supplier=Element14; Length: 2mm; ComponentLink11URL: https://datasheet.ciiva.com/7842/1776094-7842154.pdf?src-supplier=Element14; REACH SVHC: No SVHC; Design Item ID: CAP CER 10nF 50V 10% X7R 0805 SMD; ComponentLink17URL: http://www.farnell.com/datasheets/2740682.pdf?src-supplier=Element14; Operating Temperature: -55°C ~ 125°C; Depth: 1.25mm; ComponentLink8URL: https://datasheet.ciiva.com/7842/1776094-7842155.pdf?src-supplier=Element14; ComponentLink12Description: http://www.onlinecomponents.com/productFiles/mf-KEM/kem_c1002_x7r_smd.pdf?src-supplier=Onlinecomponents.com; ComponentLink16Description: http://www.farnell.com/datasheets/2740682.pdf?src-supplier=Newark; Pricing 2: 1=0,25000, 10=0,16900, 50=0,11260, 100=0,09570, 500=0,06758, 1000=0,05914 (USD); Contact Plating: Tin,Matte; Applications: General Purpose; Voltage Rating (DC): 50V; Case Code (Imperial): 0805; ComponentLink2Description: https://datasheet.ciiva.com/26923/getdatasheetpartid-772891-26923949.pdf?src-supplier=Verical; Lead Style: -; ComponentLink17Description: http://www.farnell.com/datasheets/2740682.pdf?src-supplier=Element14; ComponentLink13URL: http://www.farnell.com/datasheets/2740682.pdf?src-supplier=Farnell; Lead Free: Lead Free; ComponentLink20Description: http://catalogs.avx.com/SurfaceMount.pdf?src-supplier=Digi-Key; ComponentLink13Description: http://www.farnell.com/datasheets/2740682.pdf?src-supplier=Farnell; Thickness (Max): 0.028" (0.70mm); Voltage - Rated: 50V; ComponentLink12URL: http://www.onlinecomponents.com/productFiles/mf-KEM/kem_c1002_x7r_smd.pdf?src-supplier=Onlinecomponents.com; Temperature Coefficient: X7R; Ratings: -; ComponentLink3URL: https://datasheet.ciiva.com/5904/1776094-5904675.pdf?src-supplier=Farnell; ComponentLink22URL: https://datasheet.ciiva.com/5409/kem-c1010-x7r-hv-smd-5409176.pdf?src-supplier=Mouser; Pricing 1: 1=0.1, 10=0.031, 50=0.0168, 100=0.0142, 250=0.01164, 500=0.00998, 1000=0.00777 (USD); ComponentLink18URL: http://www.kemet.com/Lists/ProductCatalog/Attachments/53/KEM_C1002_X7R_SMD.pdf?src-supplier=Avnet; Stock 1: 1136374; ComponentLink5URL: https://datasheet.ciiva.com/7842/kem-c1003-c0g-smd-7842520.pdf?src-supplier=Element14; Size / Dimension: 0.079" L x 0.049" W (2.00mm x 1.25mm); ComponentLink8Description: https://datasheet.ciiva.com/7842/1776094-7842155.pdf?src-supplier=Element14; ComponentLink2URL: https://datasheet.ciiva.com/26923/getdatasheetpartid-772891-26923949.pdf?src-supplier=Verical; Manufacturer Part Number: GRM216R71H103KA01D; RoHS: RoHS Compliant; Voltage: 50V; ComponentLink10Description: https://datasheet.ciiva.com/14586/70095383-14586728.pdf?src-supplier=Allied+Electronics; ComponentLink15Description: https://www.verical.com/server-webapp/html/getDatasheet?partID=293414&src-supplier=Verical; ComponentLink21URL: https://datasheet.ciiva.com/26894/getdatasheetpartid-725048-26894080.pdf?src-supplier=Verical; ComponentLink5Description: https://datasheet.ciiva.com/7842/kem-c1003-c0g-smd-7842520.pdf?src-supplier=Element14; ComponentLink14Description: http://components.arrow.com/part/dataview/0323_00011329?src-supplier=Arrow+Europe; Category: Capacitors; ComponentLink9Description: https://datasheet.ciiva.com/18193/getdatasheetpartid-293878-18193318.pdf?src-supplier=Verical; Mounting Type: Surface Mount, MLCC; Height - Seated (Max): -; ComponentLink19Description: https://api.kemet.com/component-edge/download/datasheet/C0805C103K5RACTU.pdf?src-supplier=Digi-Key; Number of Pins: 2; Mount: Surface Mount,PCB; ComponentLink18Description: http://www.kemet.com/Lists/ProductCatalog/Attachments/53/KEM_C1002_X7R_SMD.pdf?src-supplier=Avnet; ComponentLink15URL: https://www.verical.com/server-webapp/html/getDatasheet?partID=293414&src-supplier=Verical; ComponentLink1URL: http://www.murata.com/~/media/webrenewal/support/library/catalog/products/capacitor/mlcc/c02e.pdf; Thickness: 0.035inch; Stock 2: 201003; ComponentLink9URL: https://datasheet.ciiva.com/18193/getdatasheetpartid-293878-18193318.pdf?src-supplier=Verical; Package / Case: 0805 (2012 Metric); ComponentLink1Description: http://www.murata.com/~/media/webrenewal/support/library/catalog/products/capacitor/mlcc/c02e.pdf; ComponentLink16URL: http://www.farnell.com/datasheets/2740682.pdf?src-supplier=Newark; ComponentLink10URL: https://datasheet.ciiva.com/14586/70095383-14586728.pdf?src-supplier=Allied+Electronics; Termination: SMD/SMT; Source: mits.SchLib; ComponentLink22Description: https://datasheet.ciiva.com/5409/kem-c1010-x7r-hv-smd-5409176.pdf?src-supplier=Mouser; ComponentLink7Description: https://datasheet.ciiva.com/28672/1789732-28672793.pdf?src-supplier=Element14; ComponentLink20URL: http://catalogs.avx.com/SurfaceMount.pdf?src-supplier=Digi-Key; ComponentLink6URL: https://datasheet.ciiva.com/7842/f9080b-0402-series-c0g-7842521.pdf?src-supplier=Element14; MOQ: 1000; ComponentLink3Description: https://datasheet.ciiva.com/5904/1776094-5904675.pdf?src-supplier=Farnell; Datasheet: http://search.murata.co.jp/Ceramy/image/img/A01X/G101/ENG/GRM216R71H103KA01-01.pdf; Case Code (Metric): 2012; Radiation Hardening: No; ComponentLink4Description: https://datasheet.ciiva.com/7172/1668701-7172393.pdf?src-supplier=Newark; ComponentLink4URL: https://datasheet.ciiva.com/7172/1668701-7172393.pdf?src-supplier=Newark; ComponentLink6Description: https://datasheet.ciiva.com/7842/f9080b-0402-series-c0g-7842521.pdf?src-supplier=Element14